# Altium footprint library MyPcbLib.PcbLib: 278 footprints (part 18 of 18)
Each footprint in its own frame and in the unit in brackets; x right, y up, seen from the top. Pads: shape width x height; smd on the part's side, far side on the other; paste and mask are expansions set on the pad; w line width, h text height; cw(c..) or ccw(c..) is an arc to the next point about the centre after c.
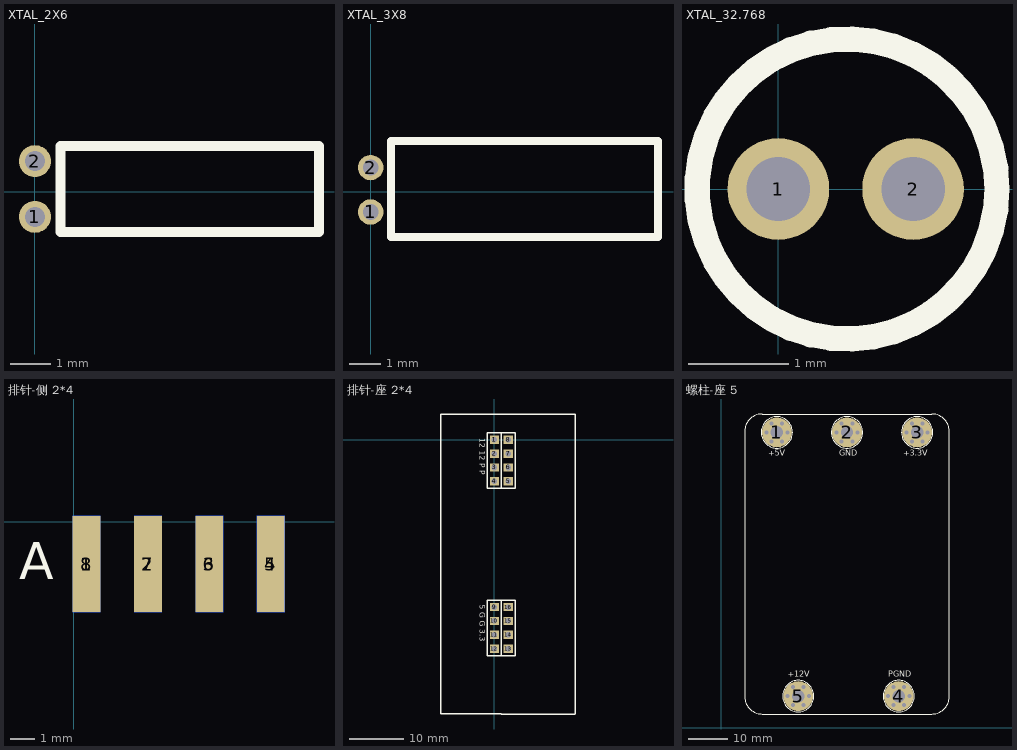
[diagram p17: the footprints below, top view; thin cyan lines are the x and y axes]

## XTAL_2X6 [mm]
pads (2):
  round 0.8 hole 0.5: 1(0,-0.635) 2(0,0.762)
Top Overlay:
  lines w0.254: 0.635,-1.016 7.112,-1.016 7.112,1.143 0.635,1.143 0.635,-1.016
3D body: height 2, standoff 0, extent 0.912,-0.94 6.912,1.052

## XTAL_3X8 [mm]
pads (2):
  round 0.8 hole 0.5: 1(0,-0.635) 2(0,0.762)
Top Overlay:
  lines w0.254: 0.635,-1.422 0.635,1.6 9.042,1.6 9.042,-1.422 0.635,-1.422
3D body: height 3, standoff 0, extent 0.912,-1.436 8.912,1.552

## XTAL_32.768 [mil] "32.768k柱式晶振（未加焊）"
height 314.96
pads (2):
  round 40 hole 25: 1(0,0) 2(53,0)
Top Overlay:
  circle w10: c27,0 r59
3D body "CRYSTAL_N.stp": height 354.33, standoff -118.11, extent -32.87,-59.06 85.24,59.06

## 排针-侧 2*4 [mil]
pads (8):
  rect 45x157 smd: 1(21.06,-68.84) 2(121.06,-68.84) 3(221.06,-68.84) 4(321.06,-68.84)
  rect 45x157 smd far side: 5(321.06,-68.84) 6(221.06,-68.84) 7(121.06,-68.84) 8(21.06,-68.84)
Top Overlay:
  text "A" at -88.94,-93.84 h60
Bottom Overlay:
  text "B" at 396.06,-88.84 h60

## 排针-座 2*4 [mil]
pads (16):
  rect 65x60 hole 40: 1(0,0) 2(0,-100) 3(0,-200) 4(0,-300) 5(100,-300) 6(100,-200) 7(100,-100) 8(100,0) 9(0,-1205) 10(0,-1305) 11(0,-1405) 12(0,-1505) 13(100,-1505) 14(100,-1405) 15(100,-1305) 16(100,-1205)
Top Overlay:
  lines w10: -384.96,-1974.92 -384.96,185.08 49.96,185.08 50,185.04 581.5,185.04 581.5,-1974.96 ; -384.92,-1974.96 50,-1974.96 50.04,-1975 581.54,-1975 ; 50,-1555 50,-1155 ; 50,-350 50,50 ; -50,-1555 150,-1555 150,-1155 -50,-1155 -50,-1555 ; -50,-350 -50,50 150,50 150,-350 -50,-350
  text "5 G G 3.3" at -105,-1190 h39.37
  text "12 12 P P" at -105,10 h39.37

## 螺柱-座 5 [mil]
pads (35):
  round 40 hole 40: 1(455.17,2966.81) 1(508.17,2875.01) 1(508.17,3058.61) 1(614.17,2875.01) 1(614.17,3058.61) 1(667.17,2966.81) 2(1160.17,2966.81) 2(1213.17,2875.01) 2(1213.17,3058.61) 2(1319.17,2875.01) 2(1319.17,3058.61) 2(1372.17,2966.81) 3(1865.17,2966.81) 3(1918.17,2875.01) 3(1918.17,3058.61) 3(2024.17,2875.01) 3(2024.17,3058.61) 3(2077.17,2966.81) 4(1680.17,316.81) 4(1733.17,225.01) 4(1733.17,408.61) 4(1839.17,225.01) 4(1839.17,408.61) 4(1892.17,316.81) 5(670.17,316.81) 5(723.17,225.01) 5(723.17,408.61) 5(829.17,225.01) 5(829.17,408.61) 5(882.17,316.81)
  round 300 hole 125: 1(561.17,2966.81) 2(1266.17,2966.81) 3(1971.17,2966.81) 4(1786.17,316.81) 5(776.17,316.81)
Bottom Layer:
  region: 516.91,2928.12 521.58,2932.93 532.63,2946.1 535.34,2950.08 537.55,2953.84 539.27,2957.4 540.5,2960.75 541.24,2963.89 541.48,2966.82 561.18,2947.13 558.25,2946.88 555.11,2946.14 551.76,2944.91 548.2,2943.19 544.44,2940.98 540.46,2938.27 536.28,2935.08 527.28,2927.22 522.48,2922.55
  lines w7.87: 488.85,2894.49 491.44,2897.09 ; 517.04,2922.68 561.17,2966.81 ; 561.17,2966.81 561.17,2966.81
  lines w39.37: 1865.17,2966.81 1865.17,2966.81
Top Overlay:
  circle w10: c776.17,316.81 r157.48
  circle w10: c1266.17,2966.81 r157.48
  circle w10: c1786.17,316.81 r157.48
  circle w10: c1971.17,2966.81 r157.48
  circle w10: c561.17,2966.81 r157.48
  lines w10: 236.17,316.81 ccw(c416.17,316.81) 416.17,136.81 2116.17,136.81 ccw(c2116.17,316.81) 2296.17,316.81 2296.17,2971.81 ccw(c2116.17,2971.81) 2116.17,3151.81 416.17,3151.81 ccw(c416.17,2971.81) 236.17,2971.81 236.17,316.81
  text "PGND" at 1680.17,511.81 h60
  text "+12V" at 669.29,511.81 h60
  text "+3.3V" at 1830.71,2731.81 h60
  text "GND" at 1186.17,2731.81 h60
  text "+5V" at 472.44,2731.81 h60
3D body "M3x14.STEP": height 553.16, standoff 1.96, extent 1159.94,2874.29 1372.39,3059.33
3D body "M3x14.STEP": height 553.16, standoff 1.96, extent 1864.94,2874.29 2077.39,3059.33
3D body "M3x14.STEP": height 553.16, standoff 1.96, extent 454.94,2874.29 667.39,3059.33
3D body "M3x14.STEP": height 553.16, standoff 1.96, extent 1679.94,224.29 1892.39,409.33
3D body "M3x14.STEP": height 553.16, standoff 1.96, extent 669.95,224.29 882.39,409.33